# Altium integrated library Integrated_Library1.IntLib: 305 symbols (part 2 of 2) (continued)
## GRM1885C1H111J
designator C?, comment Voltage: 50В  (hidden comment: 110)
Конденсатор кер. 110 пФ 50В NP0; Manufacturer: Murata; Name: GRM1885C1H111J; TKE: NP0; Value: 110
footprint C0603 (Chip Capacitor, 2-Leads, Body 1,60x0,80mm, IPC Medium Density)
pins: 1, 2

## GRM1885C1H160JA01D
designator C?, comment Voltage: 50В  (hidden comment: 16пФ)
Конденсатор кер. 16пФ 50В NP0; Manufacturer: Murata; Name: GRM1885C1H160JA01D; TKE: NP0; Value: 16пФ
footprint C0603 (Chip Capacitor, 2-Leads, Body 1,60x0,80mm, IPC Medium Density)
pins: 1, 2

## GRM1885C1H220JA01
designator C?, comment Voltage: 50В  (hidden comment: 22)
Конденсатор кер. 22пФ 50В NP0; Manufacturer: Murata; Name: GRM1885C1H220JA01; TKE: NP0; Value: 22
footprint C0603 (Chip Capacitor, 2-Leads, Body 1,60x0,80mm, IPC Medium Density)
pins: 1, 2

## GRM1885C1H241F
designator C?, comment Voltage: 50В  (hidden comment: 240)
Конденсатор кер. 240пФ 50В NP0; Manufacturer: Murata; Name: GRM1885C1H241F; TKE: NP0; Value: 240
footprint C0603 (Chip Capacitor, 2-Leads, Body 1,60x0,80mm, IPC Medium Density)
pins: 1, 2

## GRM1885C1H681J
designator C?, comment Voltage: 50В  (hidden comment: 680)
Конденсатор кер. 680пФ 50В NP0; Manufacturer: Murata; Name: GRM1885C1H681J; TKE: NP0; Value: 680
footprint C0603 (Chip Capacitor, 2-Leads, Body 1,60x0,80mm, IPC Medium Density)
pins: 1, 2

## GRM1885C2A150JA01D
designator C?, comment Voltage: 100В  (hidden comment: 15пФ)
Конденсатор кер. 15пФ 100В NP0; Manufacturer: Murata; Name: GRM1885C2A150JA01D; TKE: NP0; Value: 15пФ
footprint C0603 (Chip Capacitor, 2-Leads, Body 1,60x0,80mm, IPC Medium Density)
pins: 1, 2

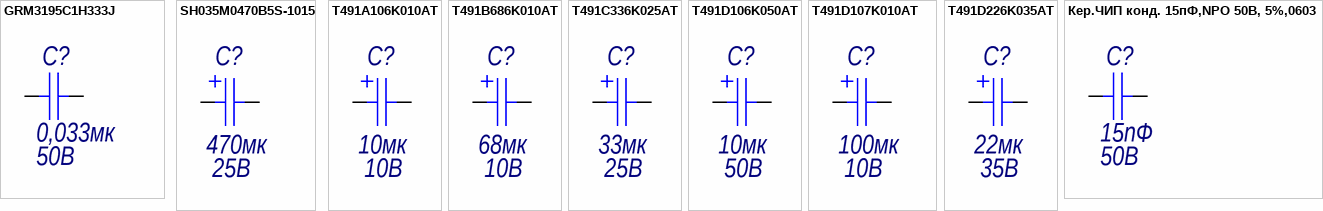
[diagram p22: symbols GRM3195C1H333J to Кер.ЧИП конд. 15пФ,NPO 50В, 5%,0603]

## GRM3195C1H333J
designator C?, comment Voltage: 50В  (hidden comment: 0,033мк)
Конденсатор кер. 0,033мкФ 50В NP0; Manufacturer: Murata; Name: GRM3195C1H333J; TKE: NP0; Value: 0,033мк
footprint C1206 (Chip Capacitor, 2-Leads, Body 3,20x1,60mm, IPC Medium Density)
pins: 1, 2

## SH035M0470B5S-1015
designator C?, comment Voltage: 25В  (hidden comment: 470мк)
Конденсатор эл.лит. алюм. 470мкФ 25В; Manufacturer: YAGEO; Name: SH035M0470B5S-1015; Value: 470мк
footprint CAPALUM_10.2x18.7 (Электролитический алюминиевый конденсатор с радиальными выводами 10.2x18.7мм)
pins: 1, 2

## T491A106K010AT
designator C?, comment Voltage: 10В  (hidden comment: 10мк)
Конденсатор тант. 10мкФ 10В 20%; Manufacturer: Kemet; Name: T491A106K010AT; ESR: 3,4 Ом; Value: 10мк
footprint CAPTANT_A
pins: 1, 2

## T491B686K010AT
designator C?, comment Voltage: 10В  (hidden comment: 68мк)
Конденсатор тант. 68мкФ 10В; Manufacturer: Kemet; Name: T491B686K010AT; ESR: 3Ом; Value: 68мк
footprint CAPTANT_B (Chip Capacitor, 2-Leads, Body 3,50x2,80mm, IPC Medium Density)
pins: 1, 2

## T491C336K025AT
designator C?, comment Voltage: 25В  (hidden comment: 33мк)
Конденсатор тант. 33мкФ 25В 20%; Manufacturer: Kemet; Name: T491C336K025AT; ESR: 0,9 Ом; Value: 33мк
footprint CAPTANT_C (Molded Capacitor, 2-Leads, Body 6,00x3,20mm, IPC Medium Density)
pins: 1, 2

## T491D106K050AT
designator C?, comment Voltage: 50В  (hidden comment: 10мк)
Конденсатор тант. 10мкФ 50В; Manufacturer: KEMET; Name: T491D106K050AT; ESR: 0,8 Ом; Value: 10мк
pins: 1, 2

## T491D107K010AT
designator C?, comment Voltage: 10В  (hidden comment: 100мк)
Конденсатор тант. 100мкФ 10В; Manufacturer: Kemet; Name: T491D107K010AT; ESR: 0,7Ом; Value: 100мк
footprint CAPTANT_D (Molded Capacitor, 2-Leads, Body 7,30x4,30mm, IPC Medium Density)
pins: 1, 2

## T491D226K035AT
designator C?, comment Voltage: 35В  (hidden comment: 22мк)
Конденсатор тант. 22мкФ 35В; Manufacturer: KEMET; Name: T491D226K035AT; ESR: 0,7 Ом; Value: 22мк
pins: 1, 2

## Кер.ЧИП конд. 15пФ,NPO 50В, 5%,0603
designator C?, comment Voltage: 50В  (hidden comment: 15пФ)
Кер.ЧИП конд. 15пФ,NPO 50В, 5%,0603; Manufacturer: ChipDip; Name: Кер.ЧИП конд. 15пФ,NPO 50В, 5%,0603; Value: 15пФ
footprint C0603 (Chip Capacitor, 2-Leads, Body 1,60x0,80mm, IPC Medium Density)
pins: 1, 2


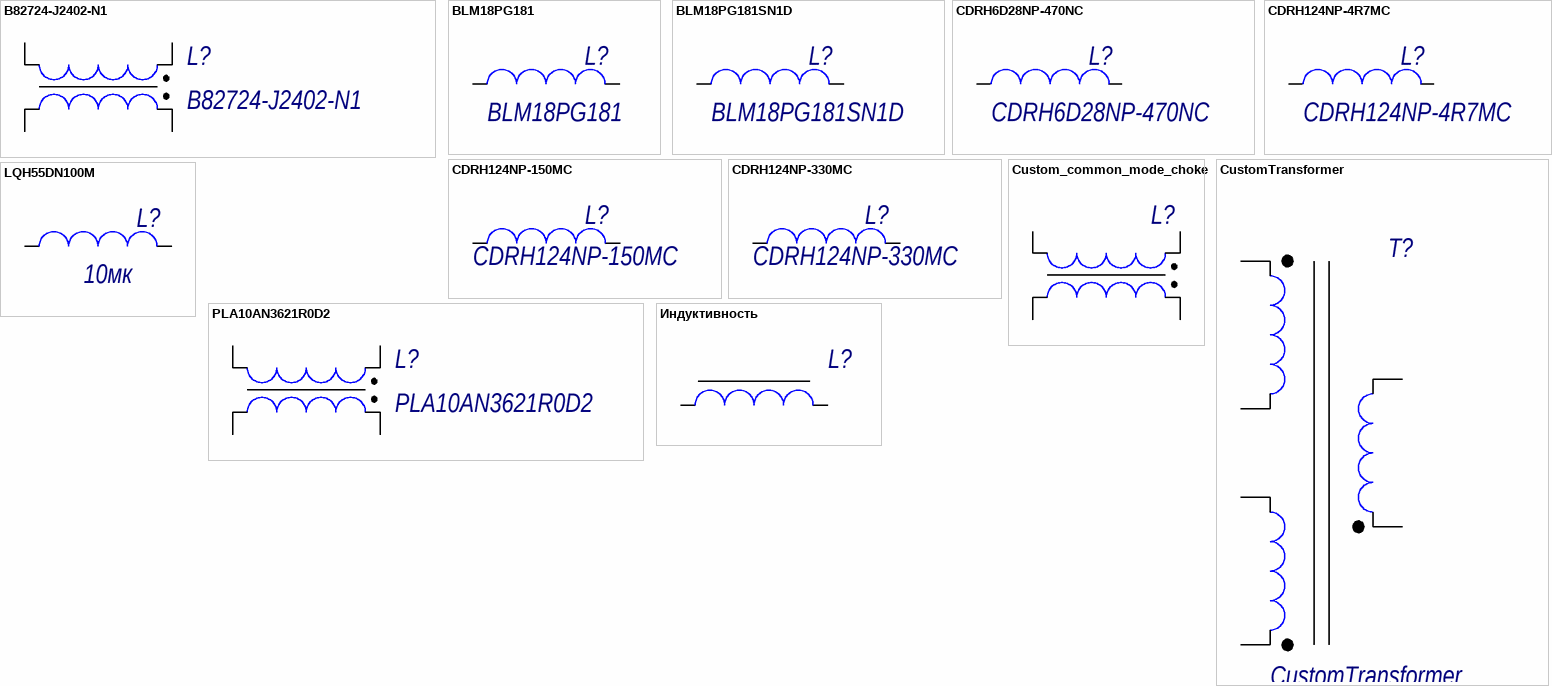
[diagram p23: symbols B82724-J2402-N1 to Индуктивность]

## B82724-J2402-N1
designator L?
Синфазный дроссель 3,3мГн 4А; Manufacturer: Epcos TDK; Inductance: 3,3мГн; Current: 4А; Name: B82724-J2402-N1
pins: 1, 2, 3, 4

## BLM18PG181
designator L?
Ферритовая бусина; Manufacturer: Murata; Name: BLM18PG181
footprint L0603 (Chip Inductor, 2-Leads, Body 1,60x0,80mm, IPC Medium Density)
pins: 1 3, 2 4

## BLM18PG181SN1D
designator L?
Ферритовая бусина 180Ом 1,5А; Manufacturer: Murata; Name: BLM18PG181SN1D
footprint L0603 (Chip Inductor, 2-Leads, Body 1,60x0,80mm, IPC Medium Density)
pins: 1 3, 2 4

## CDRH6D28NP-470NC
designator L?
Катушка с сердечником 47мкГн 0,8А; Value: 47мк; I saturation: 800мА; R: 0,238; Name: CDRH6D28NP-470NC
pins: 1 3, 2 4

## CDRH124NP-4R7MC
designator L?
Катушка с сердечником 4,7мкГн 0,8А; Value: 4,7мк; I saturation: 5,7А; R: 0,014; Name: CDRH124NP-4R7MC
footprint CDRH124
pins: 1 3, 2 4

## CDRH124NP-150MC
designator L?
Катушка с сердечником 15мкГн 3,2А; Value: 15мк; I saturation: 3,2; R: 0,050; Name: CDRH124NP-150MC
footprint CDRH124
pins: 1 3, 2 4

## CDRH124NP-330MC
designator L?
Катушка с сердечником 33мкГн 2,7А; I saturation: 2,7; R: 0,097; Value: 33мкГн; Name: CDRH124NP-330MC
footprint CDRH124
pins: 1 3, 2 4

## Custom_common_mode_choke
designator L?
Синфазный дроссель
pins: 1, 2, 3, 4

## CustomTransformer
designator T?
Трансформатор 2+1; Name: CustomTransformer; Value: *; I saturation: *
footprint B66422-W1010-D1
pins: 1, 2, 4, 5, 8, 10

## LQH55DN100M
designator L?  value 10мк  (hidden comment: LQH55DN100M)
Катушка индуктивности 10мкГн 1,7А; I saturation: 1,7А; R: 0,1302; Name: LQH55DN100M
pins: 1 3, 2 4

## PLA10AN3621R0D2
designator L?
Синфазный дроссель; Manufacturer: Epcos TDK; Current: 1А; Inductance: 3,6мГн; Name: PLA10AN3621R0D2
footprint PLA10 (синфазный дроссель murata)
pins: 1, 2, 3, 4

## Индуктивность
designator L?, comment -  (value not drawn)
Катушка с сердечником; Name: -; Value: -; I saturation: -
pins: 1 3, 2 4


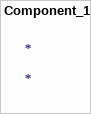
[diagram p24: symbol Component_1]

## Component_1
designator *


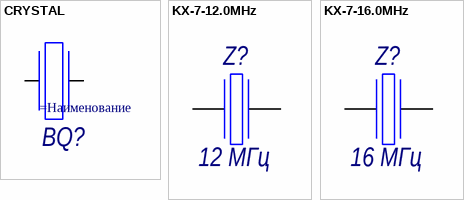
[diagram p25: symbols CRYSTAL to KX-7-16.0MHz]

## CRYSTAL
designator BQ?
pins: 1, 2

## KX-7-12.0MHz
designator Z?, comment 12 MГц
Кварцевый резонатор; Name: KX-7-12.0MHz; Value: 12 MГц
footprint QSMD3.2x2.5
pins: 1, 2

## KX-7-16.0MHz
designator Z?, comment 16 MГц
Кварцевый резонатор 16МГц; Partnumber: 12.88605; Name: KX-7-12.0MHz; Value: 16 MГц
footprint QSMD3.2x2.5
pins: 1, 2


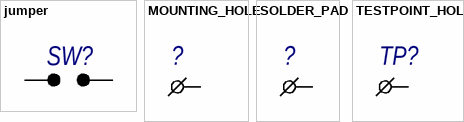
[diagram p26: symbols jumper to TESTPOINT_HOLE]

## jumper
designator SW?
Запаиваемая перемычка
footprint JUMPER_SOLDERED_3x1
pins: 1, 2

## MOUNTING_HOLE
designator ?  (no BOM)
pins: 1

## SOLDER_PAD
designator ?  (no BOM)
footprint PAD_5_8mm (Площадка для пайки 5x5 мм)
pins: 1

## TESTPOINT_HOLE
designator TP?, comment TESTPOINT  (value not drawn)  (no BOM)
Name: TESTPOINT
footprint TP_0,6X1
pins: 1


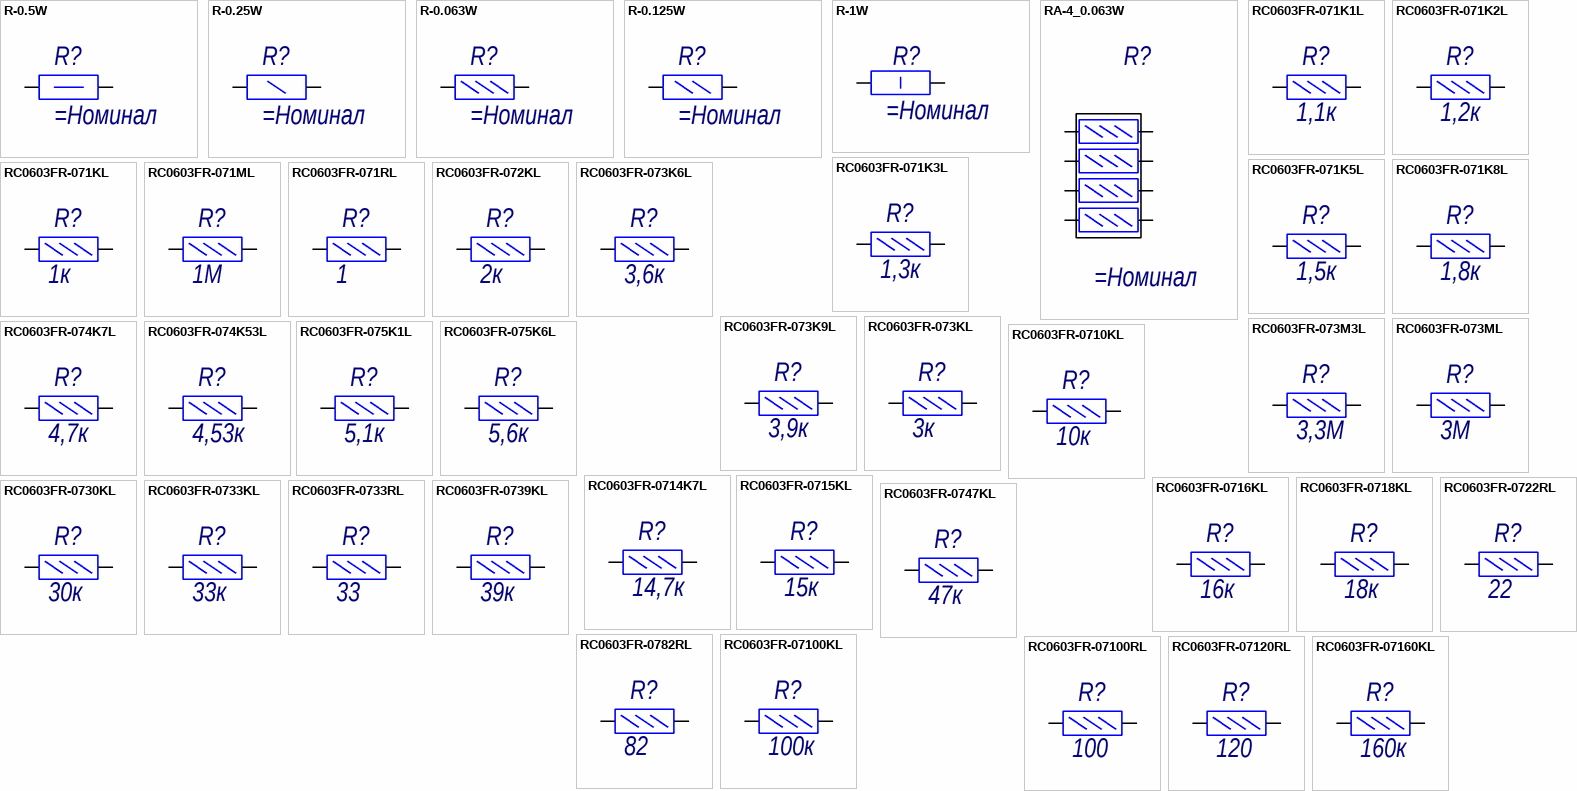
[diagram p27: symbols R-0.5W to RC0603FR-07160KL]

## R-0.5W
designator R?
Резистор 0,5Вт общий; ClassName: *
pins: 1, 2

## R-0.25W
designator R?
Резистор 0,25Вт общий; ClassName: *
pins: 1, 2

## R-0.063W
designator R?
Резистор 0,063Вт общий; ClassName: *
pins: 1, 2

## R-0.125W
designator R?
Резистор 0,125Вт общий; ClassName: *
pins: 1, 2

## R-1W
designator R?
Резистор 1Вт общий; ClassName: *
pins: 1, 2

## RA-4_0.063W
designator R?
Резисторная сборка 0,063Вт; ClassName: *
pins: 1, 2, 3, 4, 5, 6, 7, 8

## RC0603FR-071K1L
designator R?, comment 1,1к
Резистор 1,1кОм 0,063Вт 1%; Manufacturer: YAGEO; Name: RC0603FR-071K1L; Tolerance: 1%; Value: 1,1к
footprint R0603
pins: 1, 2

## RC0603FR-071K2L
designator R?, comment 1,2к
Резистор 1,2кОм 0,063Вт 1%; Manufacturer: YAGEO; Name: RC0603FR-071K2L; Tolerance: 1%; Value: 1,2к
footprint R0603
pins: 1, 2

## RC0603FR-071K3L
designator R?, comment 1,3к
Резистор 1,3кОм 0,063Вт 1%; Manufacturer: YAGEO; Name: RC0603FR-071K3L; Tolerance: 1%; Value: 1,3к
footprint R0603
pins: 1, 2

## RC0603FR-071K5L
designator R?, comment 1,5к
Резистор 1,5кОм 0,063Вт 1%; Manufacturer: YAGEO; Name: RC0603FR-071K5L; Tolerance: 1%; Value: 1,5к
footprint R0603
pins: 1, 2

## RC0603FR-071K8L
designator R?, comment 1,8к
Резистор 1,8кОм 0,063Вт 1%; Manufacturer: YAGEO; Name: RC0603FR-071K8L; Tolerance: 1%; Value: 1,8к
footprint R0603
pins: 1, 2

## RC0603FR-071KL
designator R?, comment 1к
Резистор 1кОм 0,063Вт 1%; Manufacturer: YAGEO; Name: RC0603FR-071KL; Tolerance: 1%; Value: 1к
footprint R0603
pins: 1, 2

## RC0603FR-071ML
designator R?, comment 1М
Резистор1МОм 0,1Вт 1%; Manufacturer: YAGEO; Name: RC0603FR-071ML; Tolerance: 1%; Value: 1М
footprint R0603
pins: 1, 2

## RC0603FR-071RL
designator R?, comment 1
Резистор 1Ом 0,063Вт 1%; Manufacturer: YAGEO; Name: RC0603FR-071RL; Tolerance: 1%; Value: 1
footprint R0603
pins: 1, 2

## RC0603FR-072KL
designator R?, comment 2к
Резистор 2кОм 0,063Вт 1%; Manufacturer: YAGEO; Name: RC0603FR-072KL; Tolerance: 1%; Value: 2к
footprint R0603
pins: 1, 2

## RC0603FR-073K6L
designator R?, comment 3,6к
Резистор 3,6кОм 0,063Вт 1%; Manufacturer: YAGEO; Name: RC0603FR-073K6L; Tolerance: 1%; Value: 3,6к
footprint R0603
pins: 1, 2

## RC0603FR-073K9L
designator R?, comment 3,9к
Резистор 3,9кОм 0,063Вт 1%; Manufacturer: YAGEO; Name: RC0603FR-073K9L; Tolerance: 1%; Value: 3,9к
footprint R0603
pins: 1, 2

## RC0603FR-073KL
designator R?, comment 3к
Резистор 3кОм 0,063Вт 1%; Manufacturer: YAGEO; Name: RC0603FR-073KL; Tolerance: 1%; Value: 3к
footprint R0603
pins: 1, 2

## RC0603FR-073M3L
designator R?, comment 3,3М
Резистор 3,3МОм 0,1Вт 1%; Manufacturer: YAGEO; Name: RC0603FR-073M3L; Tolerance: 1%; Value: 3,3М
footprint R0603
pins: 1, 2

## RC0603FR-073ML
designator R?, comment 3М
Резистор 3М 0,1Вт 1%; Manufacturer: YAGEO; Name: RC0603FR-073ML; Tolerance: 1%; Value: 3М
footprint R0603
pins: 1, 2

## RC0603FR-074K7L
designator R?, comment 4,7к
Резистор 4,7кОм 0,063Вт 1%; Manufacturer: YAGEO; Name: RC0603FR-074K7L; Tolerance: 1%; Value: 4,7к
footprint R0603
pins: 1, 2

## RC0603FR-074K53L
designator R?, comment 4,53к
Резистор 4,53кОм 0,1Вт 1%; Manufacturer: YAGEO; Name: RC0603FR-074K53L; Tolerance: 1%; Value: 4,53к
footprint R0603
pins: 1, 2

## RC0603FR-075K1L
designator R?, comment 5,1к
Резистор 5,1кОм 0,1Вт 1%; Manufacturer: YAGEO; Name: RC0603FR-075K1L; Tolerance: 1%; Value: 5,1к
footprint R0603
pins: 1, 2

## RC0603FR-075K6L
designator R?, comment 5,6к
Резистор 5,6кОм 0,1Вт 1%; Manufacturer: YAGEO; Name: RC0603FR-075K6L; Tolerance: 1%; Value: 5,6к
footprint R0603
pins: 1, 2

## RC0603FR-0710KL
designator R?, comment 10к
Резистор 10кОм 0,063Вт 1%; Manufacturer: YAGEO; Name: RC0603FR-0710KL; Tolerance: 1%; Value: 10к
footprint R0603
pins: 1, 2

## RC0603FR-0714K7L
designator R?, comment 14,7к
Резистор 14,7кОм 0,063Вт 1%; Manufacturer: YAGEO; Name: RC0603FR-0714K7L; Tolerance: 1%; Value: 14,7к
footprint R0603
pins: 1, 2

## RC0603FR-0715KL
designator R?, comment 15к
Резистор 15кОм 0,063Вт 1%; Manufacturer: YAGEO; Name: RC0603FR-0715KL; Tolerance: 1%; Value: 15к
footprint R0603
pins: 1, 2

## RC0603FR-0716KL
designator R?, comment 16к
Резистор 16кОм 0,063Вт 1%; Manufacturer: YAGEO; Name: RC0603FR-0716KL; Tolerance: 1%; Value: 16к
footprint R0603
pins: 1, 2

## RC0603FR-0718KL
designator R?, comment 18к
Резистор 18кОм 0,063Вт 1%; Manufacturer: YAGEO; Name: RC0603FR-0718KL; Tolerance: 1%; Value: 18к
footprint R0603
pins: 1, 2

## RC0603FR-0722RL
designator R?, comment 22
Резистор 22 Ом 0,1Вт 1%; Manufacturer: YAGEO; Name: RC0603FR-0722RL; Tolerance: 1%; Value: 22
footprint R0603
pins: 1, 2

## RC0603FR-0730KL
designator R?, comment 30к
Резистор 30кОм 0,063Вт 1%; Manufacturer: YAGEO; Name: RC0603FR-0730KL; Tolerance: 1%; Value: 30к
footprint R0603
pins: 1, 2

## RC0603FR-0733KL
designator R?, comment 33к
Резистор 33кОм 0,063Вт 1%; Manufacturer: YAGEO; Name: RC0603FR-0733KL; Tolerance: 1%; Value: 33к
footprint R0603
pins: 1, 2

## RC0603FR-0733RL
designator R?, comment 33
Резистор 33Ом 0,063Вт 1%; Manufacturer: YAGEO; Name: RC0603FR-0733RL; Tolerance: 1%; Value: 33
footprint R0603
pins: 1, 2

## RC0603FR-0739KL
designator R?, comment 39к
Резистор 39кОм 0,063Вт 1%; Manufacturer: YAGEO; Name: RC0603FR-0739KL; Tolerance: 1%; Value: 39к
footprint R0603
pins: 1, 2

## RC0603FR-0747KL
designator R?, comment 47к
Резистор 47кОм 0,063Вт 1%; Manufacturer: YAGEO; Name: RC0603FR-0747KL; Tolerance: 1%; Value: 47к
footprint R0603
pins: 1, 2

## RC0603FR-0782RL
designator R?, comment 82
Резистор 82Ом 0,063Вт 1%; Manufacturer: YAGEO; Name: RC0603FR-0782RL; Tolerance: 1%; Value: 82
footprint R0603
pins: 1, 2

## RC0603FR-07100KL
designator R?, comment 100к
Резистор 100кОм 0,1Вт 1%; Manufacturer: YAGEO; Name: RC0603FR-07100KL; Tolerance: 1%; Value: 100к
footprint R0603
pins: 1, 2

## RC0603FR-07100RL
designator R?, comment 100
Резистор 100 Ом 0,1Вт 1%; Manufacturer: YAGEO; Name: RC0603FR-07100RL; Tolerance: 1%; Value: 100
footprint R0603
pins: 1, 2

## RC0603FR-07120RL
designator R?, comment 120
Резистор 120Ом 0,063Вт 1%; Manufacturer: YAGEO; Name: RC0603FR-07120RL; Tolerance: 1%; Value: 120
footprint R0603
pins: 1, 2

## RC0603FR-07160KL
designator R?, comment 160к
Резистор 160кОм 0,063Вт 1%; Manufacturer: YAGEO; Name: RC0603FR-07160KL; Tolerance: 1%; Value: 160к
footprint R0603
pins: 1, 2

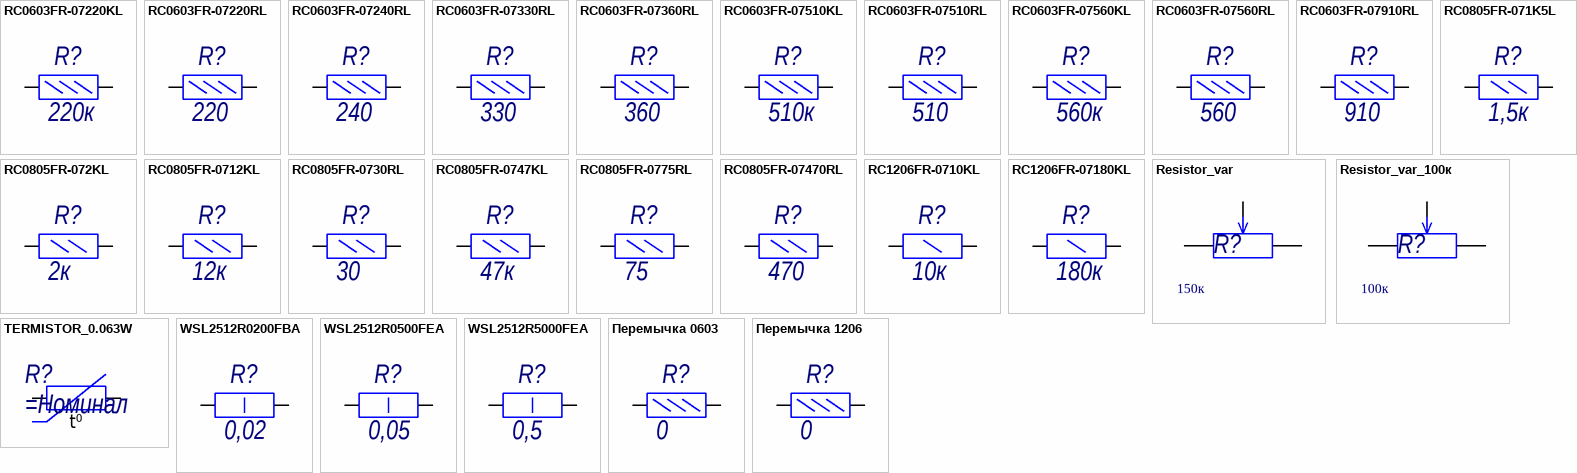
[diagram p28: symbols RC0603FR-07220KL to Перемычка 1206]

## RC0603FR-07220KL
designator R?, comment 220к
Резистор 220кОм 0,1Вт 1%; Manufacturer: YAGEO; Name: RC0603FR-07220KL; Tolerance: 1%; Value: 220к
footprint R0603
pins: 1, 2

## RC0603FR-07220RL
designator R?, comment 220
Резистор 220 Ом 0,1Вт 1%; Manufacturer: YAGEO; Name: RC0603FR-07220RL; Tolerance: 1%; Value: 220
footprint R0603
pins: 1, 2

## RC0603FR-07240RL
designator R?, comment 240
Резистор 240Ом 0,063Вт 1%; Manufacturer: YAGEO; Name: RC0603FR-07240RL; Tolerance: 1%; Value: 240
footprint R0603
pins: 1, 2

## RC0603FR-07330RL
designator R?, comment 330
Резистор 330Ом 0,063Вт 1%; Manufacturer: YAGEO; Name: RC0603FR-07330RL; Tolerance: 1%; Value: 330
footprint R0603
pins: 1, 2

## RC0603FR-07360RL
designator R?, comment 360
Резистор 360 Ом 0,1Вт 1%; Manufacturer: YAGEO; Name: RC0603FR-07360RL; Tolerance: 1%; Value: 360
footprint R0603
pins: 1, 2

## RC0603FR-07510KL
designator R?, comment 510к
Резистор 510кОм 0,1Вт 1%; Manufacturer: YAGEO; Name: RC0603FR-07510KL; Tolerance: 1%; Value: 510к
footprint R0603
pins: 1, 2

## RC0603FR-07510RL
designator R?, comment 510
Резистор 510 Ом 0,1Вт 1%; Manufacturer: YAGEO; Name: RC0603FR-07510RL; Tolerance: 1%; Value: 510
footprint R0603
pins: 1, 2

## RC0603FR-07560KL
designator R?, comment 560к
Резистор 560кОм 0,1Вт 1%; Manufacturer: YAGEO; Name: RC0603FR-07560KL; Tolerance: 1%; Value: 560к
footprint R0603
pins: 1, 2

## RC0603FR-07560RL
designator R?, comment 560
Резистор 560 Ом 0,1Вт 1%; Manufacturer: YAGEO; Name: RC0603FR-07560RL; Tolerance: 1%; Value: 560
footprint R0603
pins: 1, 2

## RC0603FR-07910RL
designator R?, comment 910
Резистор 910Ом 0,063Вт 1%; Manufacturer: YAGEO; Name: RC0603FR-07910RL; Tolerance: 1%; Value: 910
footprint R0603
pins: 1, 2

## RC0805FR-071K5L
designator R?, comment 1,5к
Резистор 1,5к 0,125Вт 1%; Manufacturer: YAGEO; Name: RC0805FR-071K5L; Tolerance: 1%; Value: 1,5к
footprint R0805 (Chip Resistor, 2-Leads, Body 2,10x1,30mm, IPC Medium Density)
pins: 1, 2

## RC0805FR-072KL
designator R?, comment 2к
Резистор 2кОм 0,125Вт 1%; Manufacturer: YAGEO; Name: RC0805FR-072KL; Tolerance: 1%; Value: 2к
footprint R0805 (Chip Resistor, 2-Leads, Body 2,10x1,30mm, IPC Medium Density)
pins: 1, 2

## RC0805FR-0712KL
designator R?, comment 12к
Резистор 12к 0,125Вт 1%; Manufacturer: YAGEO; Name: RC0805FR-0712KL; Tolerance: 1%; Value: 12к
footprint R0805 (Chip Resistor, 2-Leads, Body 2,10x1,30mm, IPC Medium Density)
pins: 1, 2

## RC0805FR-0730RL
designator R?, comment 30
Резистор 30 0,125Вт 1%; Manufacturer: YAGEO; Name: RC0805FR-0730RL; Tolerance: 1%; Value: 30
footprint R0805 (Chip Resistor, 2-Leads, Body 2,10x1,30mm, IPC Medium Density)
pins: 1, 2

## RC0805FR-0747KL
designator R?, comment 47к
Резистор 47к 0,125Вт 1%; Manufacturer: YAGEO; Name: RC0805FR-0747KL; Tolerance: 1%; Value: 47к
footprint R0805 (Chip Resistor, 2-Leads, Body 2,10x1,30mm, IPC Medium Density)
pins: 1, 2

## RC0805FR-0775RL
designator R?, comment 75
Резистор 75 Ом 0,125Вт 1%; Manufacturer: YAGEO; Name: RC0805FR-0775RL; Tolerance: 1%; Value: 75
footprint R0805 (Chip Resistor, 2-Leads, Body 2,10x1,30mm, IPC Medium Density)
pins: 1, 2

## RC0805FR-07470RL
designator R?, comment 470
Резистор 470 0,125Вт 1%; Manufacturer: YAGEO; Name: RC0805FR-07470RL; Tolerance: 1%; Value: 470
footprint R0805 (Chip Resistor, 2-Leads, Body 2,10x1,30mm, IPC Medium Density)
pins: 1, 2

## RC1206FR-0710KL
designator R?, comment 10к
Резистор 10к 0,25Вт 1%; Manufacturer: YAGEO; Name: RC1206FR-0710KL; Value: 10к
footprint R1206 (Chip Resistor, 2-Leads, Body 3,10x1,60mm, IPC Medium Density)
pins: 1, 2

## RC1206FR-07180KL
designator R?, comment 180к
Резистор 180к 0,25Вт 1%; Manufacturer: YAGEO; Name: RC1206FR-07180KL; Value: 180к
footprint R1206 (Chip Resistor, 2-Leads, Body 3,10x1,60mm, IPC Medium Density)
pins: 1, 2

## Resistor_var
designator R?, comment 150к
переменный резистор 150к; Value: 150к
pins: 1, 2, 3

## Resistor_var_100к
designator R?, comment 100к
переменный резистор 100к; Value: 100к
pins: 1, 2, 3

## TERMISTOR_0.063W
designator R?
термистор; ClassName: *
pins: 1, 2
1 alternate drawing of the same symbol
text: t⁰

## WSL2512R0200FBA
designator R?, comment 0,02
Резистор 0,02 1Вт 1%; Manufacturer: Vishay; Name: WSL2512R0200F; Tolerance: 1%; Value: 0,02
footprint R2512 (Footprint not found)
pins: 1, 2

## WSL2512R0500FEA
designator R?, comment 0,05
Резистор 0,05 1Вт 1%; Manufacturer: Vishay; Name: WSL2512R0500F; Tolerance: 1%; Value: 0,05
footprint R2512 (Footprint not found)
pins: 1, 2

## WSL2512R5000FEA
designator R?, comment 0,5
Резистор 0,5 1Вт 1%; Manufacturer: Vishay; Name: WSL2512R5000FEA; Tolerance: 1%; Value: 0,5
footprint R2512 (Footprint not found)
pins: 1, 2

## Перемычка 0603
designator R?, comment 0
Перемычка 0603; Name: Перемычка 0603; Value: 0
footprint R0603
pins: 1, 2

## Перемычка 1206
designator R?, comment 0
Перемычка 1206; Name: Перемычка 1206; Value: 0
footprint R1206 (Chip Resistor, 2-Leads, Body 3,10x1,60mm, IPC Medium Density)
pins: 1, 2